# Altium footprint library USB Connectors.PcbLib: 41 footprints (part 2 of 3)
Each footprint in its own frame and in the unit in brackets; x right, y up, seen from the top. Pads: shape width x height; smd on the part's side, far side on the other; paste and mask are expansions set on the pad; w line width, h text height; cw(c..) or ccw(c..) is an arc to the next point about the centre after c.
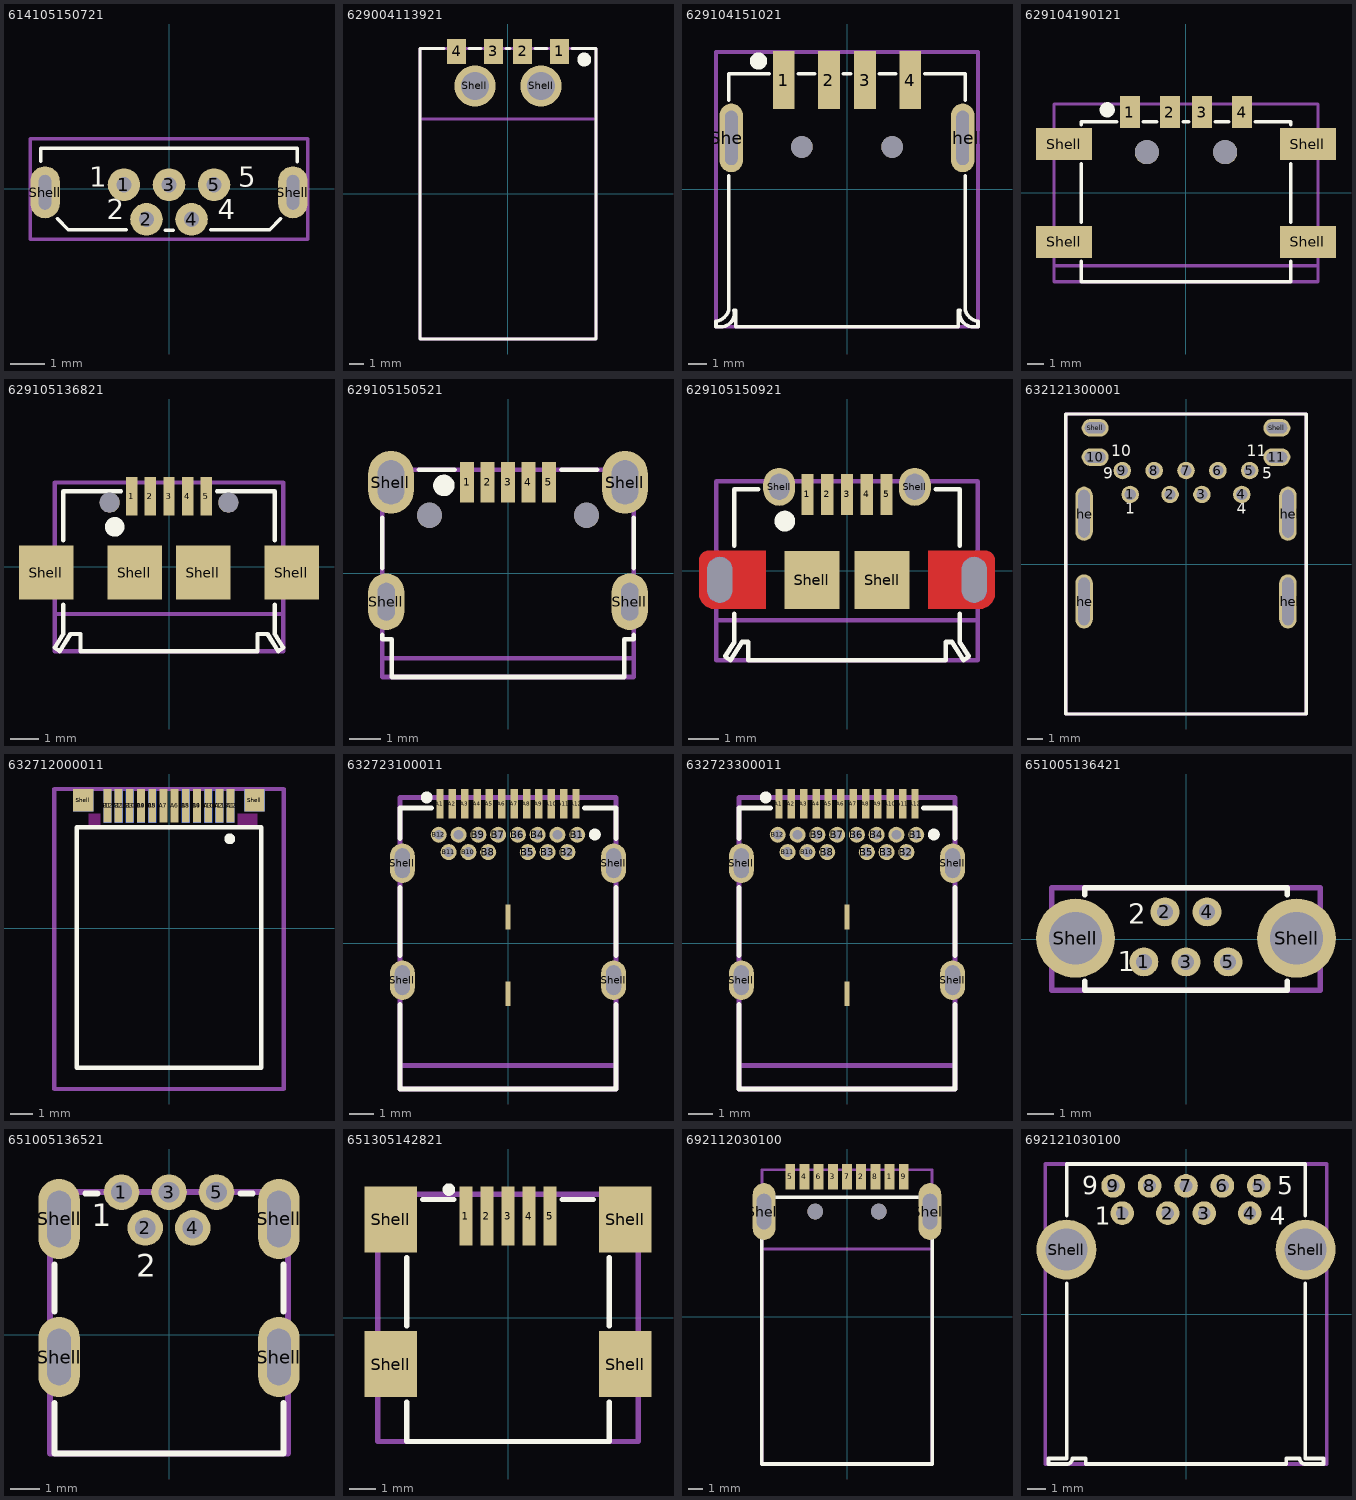
[diagram p1: the footprints below, top view; thin cyan lines are the x and y axes]

## 614105150721 [mm] "Micro USB 2.0 Type B Vertical 5 Contacts"
height 5.61
pads (7):
  round 0.94 hole 0.44: 1(-1.3,0.125) 2(-0.65,-0.875) 3(0,0.125) 4(0.65,-0.875) 5(1.3,0.125)
  oval 0.85x1.5 hole 0.35 slot 1 at 90 deg: Shell(-3.575,-0.095) Shell(3.575,-0.095)
Top Overlay:
  lines w0.1: -3.7,0.795 -3.7,1.175 3.7,1.175 3.7,0.785 ; -3.225,-0.85 -2.9,-1.175 -1.23,-1.175 ; -0.11,-1.185 0.12,-1.185 ; 1.21,-1.175 2.9,-1.175 3.225,-0.85
  text "4" at 1.4,-1.075 h1
  text "5" at 2,-0.14 h1
  text "2" at -1.8,-1.075 h1
  text "1" at -2.3,-0.14 h1
Mechanical 13:
  lines w0.1: -4,-1.45 -4,1.45 4,1.45 4,-1.45 -4,-1.45
3D body "614105150721.stp": height 5.61, standoff -1.84, extent -4,-1.45 4,1.45

## 629004113921 [mm] "USB 2.0 Plug Type A SMT with Clip"
height 19.8
pads (6):
  rect 1.3x1.7 smd: 1(3.5,9.7) 2(1,9.7) 3(-1,9.7) 4(-3.5,9.7)
  round 2.8 hole 1.9: Shell(-2.25,7.35) Shell(2.25,7.35)
Top Overlay:
  circle w0.5: c5.2,9.15 r0.224
  lines w0.2: -4.35,9.9 -6,9.9 -6,-9.9 6,-9.9 6,9.9 4.35,9.9 ; -2.65,9.9 -1.85,9.9 ; -0.15,9.9 0.15,9.9 ; 1.85,9.9 2.65,9.9
Mechanical 13:
  lines w0.2: -6,-9.9 -6,9.9 6,9.9 6,-9.9 -6,-9.9
Mechanical 15:
  lines w0.2: -6,5.1 6,5.1
  text "PCB Edge" at -2,4.05 h1
3D body "629004113921.stp": height 2.25, standoff -2.25, extent -6,-9.9 6,9.9

## 629104151021 [mm] "USB 2.0 Type A Horizontal SMT with pegs"
height 7
pads (8):
  rect 1.2x3.2 smd: 1(-3.5,6.05) 2(-1,6.05) 3(1,6.05) 4(3.5,6.05)
  oval 1.3x3.8 hole 0.7 slot 3 at 90 deg: Shell(-6.4,2.85) Shell(6.4,2.85)
  round 1.2 hole 1.2 unplated: ""(-2.5,2.35) ""(2.5,2.35)
Top Overlay:
  circle w0.5: c-4.9,7.1 r0.224
  lines w0.2: -7.25,-7.308 -7.25,-7.6 -6.87,-7.599 ccw(c-6.983,-6.857) -6.25,-6.7 -6.15,-6.7 -6.15,-7.6 6.15,-7.6 6.15,-6.7 6.25,-6.7 ccw(c6.983,-6.857) 6.87,-7.599 7.25,-7.6 7.25,-7.308 ; -7.249,-7.308 ccw(c-7.39,-6.44) -6.55,-6.7 -6.55,0.76 ; -6.55,4.94 -6.55,6.4 -4.3,6.4 ; -2.7,6.4 -1.8,6.4 ; -0.2,6.4 0.2,6.4 ; 1.8,6.4 2.7,6.4 ; 4.3,6.4 6.55,6.4 6.55,4.94 ; 6.55,0.76 6.55,-6.7 ccw(c7.39,-6.44) 7.249,-7.308
Mechanical 13:
  lines w0.2: -7.25,-7.6 7.25,-7.6 7.25,7.6 -7.25,7.6 -7.25,-7.6
3D body "629104151021.stp": height 7.4, standoff -2.1, extent -7.25,-7.6 7.25,7.6

## 629104190121 [mm] "USB 2.0 Type A Horizontal SMT Short Type"
height 6.3
pads (10):
  rect 1.25x2 smd: 1(-3.5,5.045) 2(-1,5.045) 3(1,5.045) 4(3.5,5.045)
  rect 3.5x2 smd: Shell(-7.625,-3.055) Shell(-7.625,3.045) Shell(7.625,-3.055) Shell(7.625,3.045)
  round 1.5 hole 1.5 unplated: ""(-2.45,2.545) ""(2.45,2.545)
Top Overlay:
  circle w0.5: c-4.924,5.195 r0.224
  lines w0.2: -6.55,-4.255 -6.55,-5.555 6.55,-5.555 6.55,-4.255 ; -6.55,-1.855 -6.55,1.845 ; -6.55,4.245 -6.55,4.445 -4.32,4.445 ; -2.68,4.445 -1.82,4.445 ; -0.18,4.445 0.18,4.445 ; 1.82,4.445 2.68,4.445 ; 4.32,4.445 6.55,4.445 6.55,4.245 ; 6.55,-1.855 6.55,1.845
Mechanical 13:
  lines w0.2: -8.25,-5.555 8.25,-5.555 8.25,5.555 -8.25,5.555 -8.25,-5.555
Mechanical 15:
  lines w0.2: -8.25,-4.555 8.25,-4.555
  text "PCB Edge" at -2,-4.155 h1
3D body "STEP-629104190121-rev1.stp": height 6.37, standoff -0.1, extent -8.25,-5.555 8.25,5.554

## 629105136821 [mm] "Micro USB 2.0 SMT Type B Horizontal 5 Contacts"
height 3
pads (11):
  rect 0.4x1.35 smd: 1(-1.3,2.475) 2(-0.65,2.475) 3(0,2.475) 4(0.65,2.475) 5(1.3,2.475)
  rect 1.9x1.9 smd: Shell(-4.3,-0.2) Shell(-1.2,-0.2) Shell(1.2,-0.2) Shell(4.3,-0.2)
  round 0.7 hole 0.7 unplated: ""(-2.075,2.25) ""(2.075,2.25)
Top Overlay:
  circle w0.4: c-1.9,1.4 r0.141
  lines w0.15: -3.7,-1.33 -3.7,-2.35 -4,-2.825 -3.825,-2.95 -3.45,-2.35 -3.1,-2.35 -3.1,-2.95 3.1,-2.95 3.1,-2.35 3.45,-2.35 3.825,-2.95 4,-2.825 3.7,-2.35 3.7,-1.33 ; -3.7,0.93 -3.7,2.65 -1.68,2.65 ; 1.68,2.65 3.7,2.65 3.7,0.93
Mechanical 13:
  lines w0.15: -4,-2.95 4,-2.95 4,2.95 -4,2.95 -4,-2.95
Mechanical 15:
  lines w0.15: -4,-1.65 4,-1.65
  text "PCB Edge" at -1.8,-2.45 h1
3D body "629105136821.stp": height 2.75, standoff -0.61, extent -4,-2.95 4,2.973

## 629105150521 [mm] "Micro USB 2.0 SMT Type B Horizontal 5 Contacts High Current"
height 2.66
pads (11):
  rect 0.45x1.3 smd: 1(-1.3,2.9) 2(-0.65,2.9) 3(0,2.9) 4(0.65,2.9) 5(1.3,2.9)
  oval 1.15x1.8 hole 0.55 slot 1.2 at 90 deg: Shell(-3.875,-0.9) Shell(3.875,-0.9)
  oval 1.45x2 hole 0.85 slot 1.4 at 90 deg: Shell(-3.725,2.9) Shell(3.725,2.9)
  round 0.8 hole 0.8 unplated: ""(-2.5,1.85) ""(2.5,1.85)
Top Overlay:
  circle w0.4: c-2.041,2.8 r0.141
  lines w0.15: -4,-1.96 -4,-2.1 -3.7,-2.1 -3.7,-3.3 3.7,-3.3 3.7,-2.1 4,-2.1 4,-1.96 ; -4,0.17 -4,1.77 ; -2.83,3.3 -1.7,3.3 ; 1.7,3.3 2.83,3.3 ; 4,0.17 4,1.77
Mechanical 13:
  lines w0.15: -4,-3.3 4,-3.3 4,3.3 -4,3.3 -4,-3.3
Mechanical 15:
  lines w0.15: -4,-2.7 4,-2.7
  text "PCB Edge" at -1.9,-2.4 h1
3D body "Download_STP_629105150521.stp": height 2.71, standoff -0.85, extent -4,-3.3 4,3.303

## 629105150921 [mm] "Micro USB 2.0 Type AB Horizontal"
height 3
pads (11):
  rect 0.4x1.35 smd: 1(-1.3,2.51) 2(-0.65,2.51) 3(0,2.51) 4(0.65,2.51) 5(1.3,2.51)
  round 0 / inner round 0 / far side oval 1.4x2.1 hole 0.825 slot 1.5 at 90 deg: Shell(-4.175,-0.295) Shell(4.175,-0.295)
  oval 1.05x1.25 hole 0.65 slot 0.85 at 90 deg: Shell(-2.225,2.76) Shell(2.225,2.76)
  rect 1.8x1.9 smd: Shell(-1.15,-0.295) Shell(1.15,-0.295)
Top Layer:
  region: 4.353,-1.245 4.452,-1.245 4.636,-1.169 4.776,-1.028 4.852,-0.844 4.852,-0.745 4.852,0.355 4.852,0.415 4.807,0.525 4.722,0.609 4.612,0.655 4.553,0.655 2.668,0.655 2.668,-1.245
  region: -4.353,-1.245 -4.452,-1.245 -4.636,-1.169 -4.776,-1.028 -4.852,-0.844 -4.852,-0.745 -4.852,0.355 -4.852,0.415 -4.807,0.525 -4.722,0.609 -4.612,0.655 -4.553,0.655 -2.668,0.655 -2.668,-1.245
Top Overlay:
  circle w0.4: c-2.041,1.632 r0.141
  lines w0.15: -3.7,-1.415 -3.7,-2.335 -4,-2.81 -3.825,-2.935 -3.45,-2.335 -3.24,-2.335 -3.24,-2.935 3.24,-2.935 3.24,-2.335 3.45,-2.335 3.825,-2.935 4,-2.81 3.7,-2.335 3.7,-1.415 ; -3.7,0.825 -3.7,2.675 -2.92,2.675 ; 2.92,2.675 3.7,2.675 3.7,0.825
Mechanical 13:
  lines w0.15: -4.3,-2.935 4.3,-2.935 4.3,2.935 -4.3,2.935 -4.3,-2.935
Mechanical 15:
  lines w0.15: -4.3,-1.625 4.3,-1.625
  text "PCB Edge" at -1.9,-2.5 h1
3D body "629105150921.stp": height 2.78, standoff -0.5, extent -4.3,-2.935 4.3,2.935

## 632121300001 [mm] "USB 3.1 Type A Receptacle Horizontal THT Power Delivery"
height 8.01
pads (17):
  round 1.1 hole 0.7: 1(-3.5,4.365) 2(-1,4.365) 3(1,4.365) 4(3.5,4.365) 5(4,5.865) 6(2,5.865) 7(0,5.865) 8(-2,5.865) 9(-4,5.865)
  oval 1.7x1.1 hole 0.7 slot 1.3 at 0 deg: 10(-5.7,6.705) 11(5.7,6.705) Shell(-5.7,8.545) Shell(5.7,8.545)
  oval 1.1x3.4 hole 0.7 slot 3 at 90 deg: Shell(-6.4,-2.345) Shell(-6.4,3.155) Shell(6.4,-2.345) Shell(6.4,3.155)
Top Overlay:
  lines w0.2: -7.55,-9.415 7.55,-9.415 7.55,9.415 -7.55,9.415 -7.55,-9.415
  text "1" at -3.8,2.9 h1.2
  text "4" at 3.2,2.903 h1.2
  text "5" at 4.8,5.113 h1.2
  text "9" at -5.2,5.1 h1.2
  text "10" at -4.7,6.513 h1.2
  text "11" at 3.8,6.5 h1.2
Mechanical 13:
  lines w0.2: -7.55,-9.415 -7.55,9.415 7.55,9.415 7.55,-9.415 -7.55,-9.415
3D body "632121300001.stp": height 8.01, standoff -1.81, extent -7.55,-9.415 7.55,9.415

## 632712000011 [mm] "USB 3.1 Type C Plug Horizontal SMT"
height 2.4
pads (26):
  rect 0.35x1.5 smd: A1(2.75,5.475) A2(2.25,5.475) A3(1.75,5.475) A4(1.25,5.475) A5(0.75,5.475) A6(0.25,5.475) A7(-0.25,5.475) A8(-0.75,5.475) A9(-1.25,5.475) A10(-1.75,5.475) A11(-2.25,5.475) A12(-2.75,5.475)
  rect 0.35x1.5 smd far side: B1(-2.75,5.475) B2(-2.25,5.475) B3(-1.75,5.475) B4(-1.25,5.475) B5(-0.75,5.475) B8(0.75,5.475) B9(1.25,5.475) B10(1.75,5.475) B11(2.25,5.475) B12(2.75,5.475)
  rect 0.9x1 smd: Shell(-3.83,5.725) Shell(3.82,5.725)
  rect 0.9x1 smd far side: Shell(-3.83,5.725) Shell(3.82,5.725)
Top Overlay:
  circle w0.25: c2.712,4 r0.114
  lines w0.2: -4.125,-6.225 -4.125,4.525 4.125,4.525 4.125,-6.225 -4.125,-6.225
Bottom Overlay:
  circle w0.25: c-2.712,4 r0.114
  lines w0.2: -4.125,-6.225 4.125,-6.225 4.125,4.525 -4.125,4.525 -4.125,-6.225
Keep-Out Layer:
  board cut-out: -3.58,4.525 -3.58,5.125 -3.08,5.125 -3.08,4.525
  board cut-out: 3.075,4.525 3.075,5.125 3.945,5.125 3.945,4.525
Mechanical 13:
  lines w0.2: -5.125,-7.175 5.125,-7.175 5.125,6.225 -5.125,6.225 -5.125,-7.175
3D body "632712000011.stp": height 1.9, standoff -2.3, extent -5.125,-7.175 5.125,6.225

## 632723100011 [mm] "USB 3.1 Type C Receptacle Horizontal THR"
height 2.96
pads (32):
  rect 0.3x1.2 smd: A1(-2.75,5.635) A2(-2.25,5.635) A3(-1.75,5.635) A4(-1.25,5.635) A5(-0.75,5.635) A6(-0.25,5.635) A7(0.25,5.635) A8(0.75,5.635) A9(1.25,5.635) A10(1.75,5.635) A11(2.25,5.635) A12(2.75,5.635)
  round 0.65 hole 0.4: B1(2.8,4.385) B2(2.4,3.685) B3(1.6,3.685) B4(1.2,4.385) B5(0.8,3.685) B6(0.4,4.385) B7(-0.4,4.385) B8(-0.8,3.685) B9(-1.2,4.385) B10(-1.6,3.685) B11(-2.4,3.685) B12(-2.8,4.385) Shell(-2,4.385) Shell(2,4.385)
  oval 1x1.6 hole 0.6 slot 1.2 at 90 deg: Shell(-4.27,-1.495) Shell(-4.27,3.235) Shell(4.27,-1.495) Shell(4.27,3.235)
  rect 0.2x1 smd: ""(0,-2.045) ""(0,1.055)
Top Overlay:
  circle w0.25: c-3.288,5.895 r0.114
  circle w0.25: c3.512,4.395 r0.114
  lines w0.2: -4.37,-2.485 -4.37,-5.895 4.37,-5.895 4.37,-2.485 ; -4.37,-0.495 -4.37,2.245 ; -4.37,4.225 -4.37,5.465 -3.1,5.465 ; 3.1,5.465 4.37,5.465 4.37,4.225 ; 4.37,-0.495 4.37,2.245
Mechanical 13:
  lines w0.2: -4.37,-5.895 4.37,-5.895 4.37,5.895 -4.37,5.895 -4.37,-5.895
Mechanical 15:
  lines w0.2: -4.37,-4.945 4.37,-4.945
3D body "632723100011.stp": height 3.05, standoff -1.41, extent -4.37,-5.895 4.37,5.899

## 632723300011 [mm] "USB 3.1 Type C Receptacle Horizontal THR"
height 2.96
pads (32):
  rect 0.3x1.2 smd: A1(-2.75,5.635) A2(-2.25,5.635) A3(-1.75,5.635) A4(-1.25,5.635) A5(-0.75,5.635) A6(-0.25,5.635) A7(0.25,5.635) A8(0.75,5.635) A9(1.25,5.635) A10(1.75,5.635) A11(2.25,5.635) A12(2.75,5.635)
  round 0.65 hole 0.4: B1(2.8,4.385) B2(2.4,3.685) B3(1.6,3.685) B4(1.2,4.385) B5(0.8,3.685) B6(0.4,4.385) B7(-0.4,4.385) B8(-0.8,3.685) B9(-1.2,4.385) B10(-1.6,3.685) B11(-2.4,3.685) B12(-2.8,4.385) Shell(-2,4.385) Shell(2,4.385)
  oval 1x1.6 hole 0.6 slot 1.2 at 90 deg: Shell(-4.27,-1.495) Shell(-4.27,3.235) Shell(4.27,-1.495) Shell(4.27,3.235)
  rect 0.2x1 smd: ""(0,-2.045) ""(0,1.055)
Top Overlay:
  circle w0.25: c3.512,4.395 r0.114
  circle w0.25: c-3.288,5.895 r0.114
  lines w0.2: -4.37,-2.485 -4.37,-5.895 4.37,-5.895 4.37,-2.485 ; -4.37,-0.495 -4.37,2.245 ; -4.37,4.225 -4.37,5.465 -3.1,5.465 ; 3.1,5.465 4.37,5.465 4.37,4.225 ; 4.37,-0.495 4.37,2.245
Mechanical 13:
  lines w0.2: -4.37,-5.895 -4.37,5.895 4.37,5.895 4.37,-5.895 -4.37,-5.895
Mechanical 15:
  lines w0.2: -4.37,-4.945 4.37,-4.945
3D body "632723300011.stp": height 3.05, standoff -1.81, extent -4.37,-5.895 4.37,5.899

## 651005136421 [mm] "Mini USB 2.0 Type B Vertical 5 Contacts"
height 9.2
pads (7):
  round 1.1 hole 0.6: 1(-1.6,-0.87) 2(-0.8,1.03) 3(0,-0.87) 4(0.8,1.03) 5(1.6,-0.87)
  round 3 hole 2: Shell(-4.2,0.03) Shell(4.2,0.03)
Top Overlay:
  lines w0.2: -3.85,-1.6 -3.85,-1.95 3.85,-1.95 3.85,-1.6 ; -3.85,1.67 -3.85,1.95 3.85,1.95 3.85,1.67
  text "1" at -2.6,-1.22 h0.76
  text "2" at -2.2,0.58 h0.76
Mechanical 13:
  lines w0.2: -5.1,-1.95 5.1,-1.95 5.1,1.95 -5.1,1.95 -5.1,-1.95
3D body "651005136421.stp": height 9.45, standoff -2.75, extent -5.102,-1.92 5.102,1.98

## 651005136521 [mm] "Mini USB 2.0 Type B Horizontal 5 Contacts"
height 3.9
pads (9):
  round 1.2 hole 0.7: 1(-1.6,4.8) 2(-0.8,3.6) 3(0,4.8) 4(0.8,3.6) 5(1.6,4.8)
  oval 1.4x2.7 hole 0.8 slot 1.9 at 90 deg: Shell(-3.7,-0.75) Shell(-3.7,3.9) Shell(3.7,-0.75) Shell(3.7,3.9)
Top Overlay:
  lines w0.2: -3.85,-2.29 -3.85,-4 3.85,-4 3.85,-2.29 ; -3.85,0.78 -3.85,2.36 ; -2.82,4.75 -2.4,4.75 ; 2.4,4.75 2.82,4.75 ; 3.85,0.78 3.85,2.36
  text "1" at -2.6,3.65 h0.76
  text "2" at -1.1,1.95 h0.76
Mechanical 13:
  lines w0.2: -4,-4 4,-4 4,4.8 -4,4.8 -4,-4
3D body "651005136521-rev1.stp": height 3.95, standoff -2.55, extent -4.075,-4 4.075,4.825

## 651305142821 [mm] "Mini USB 2.0 Type AB SMT Horizontal 5 Contacts"
height 4
pads (9):
  rect 0.5x2.25 smd: 1(-1.6,3.865) 2(-0.8,3.865) 3(0,3.865) 4(0.8,3.865) 5(1.6,3.865)
  rect 2x2.5 smd: Shell(-4.45,-1.76) Shell(-4.45,3.74) Shell(4.45,-1.76) Shell(4.45,3.74)
Top Overlay:
  circle w0.25: c-2.248,4.872 r0.114
  lines w0.2: -3.85,-3.21 -3.85,-4.7 3.85,-4.7 3.85,-3.21 ; -3.85,-0.31 -3.85,2.29 ; -3.25,4.5 -2.05,4.5 ; 2.05,4.5 3.25,4.5 ; 3.85,-0.31 3.85,2.29
Mechanical 13:
  lines w0.2: -4.95,-4.7 -4.95,4.7 4.95,4.7 4.95,-4.7 -4.95,-4.7
3D body "651305142821.stp": height 4.1, standoff 0, extent -4.95,-4.7 4.95,4.7

## 692112030100 [mm] "USB 3.0 Type A SMT Plug with Clip"
height 4.5
pads (13):
  rect 0.7x1.8 smd: 1(3,9.875) 2(1,9.875) 3(-1,9.875) 4(-3,9.875) 5(-4,9.875) 6(-2,9.875) 7(0,9.875) 8(2,9.875) 9(4,9.875)
  oval 1.6x4 hole 1 slot 2.5 at 90 deg: Shell(-5.85,7.425) Shell(5.85,7.425)
  round 1.1 hole 1.1 unplated: ""(-2.25,7.425) ""(2.25,7.425)
Top Overlay:
  lines w0.254: -6,-10.375 6,-10.375 6,8.425 -6,8.425 -6,-10.375
Mechanical 13:
  lines w0.2: -6,-10.375 6,-10.375 6,10.375 -6,10.375 -6,-10.375
Mechanical 15:
  lines w0.2: -6,4.775 6,4.775
  text "PCB Edge" at -2,3.725 h1
3D body "692112030100.stp": height 1.85, standoff -2.65, extent -6,-10.375 6,10.375

## 692121030100 [mm] "USB 3.0 Type A Horizontal"
height 6.99
pads (11):
  round 1.3 hole 0.7: 1(-3.5,5.54) 2(-1,5.54) 3(1,5.54) 4(3.5,5.54) 5(4,7.04) 6(2,7.04) 7(0,7.04) 8(-2,7.04) 9(-4,7.04)
  round 3.3 hole 2.3: Shell(-6.57,3.54) Shell(6.57,3.54)
Top Overlay:
  lines w0.2: -6.55,1.69 -6.55,-7.94 -7.55,-7.94 -7.55,-8.24 -6.56,-8.24 ccw(c-6.55,-7.94) -6.25,-7.94 -5.5,-7.94 -5.5,-8.24 5.5,-8.24 5.5,-7.94 6.25,-7.94 ccw(c6.55,-7.94) 6.56,-8.24 7.55,-8.24 7.55,-7.94 6.55,-7.94 6.55,1.69 ; -6.55,5.39 -6.55,8.24 6.55,8.24 6.55,5.39
  text "5" at 5,6.59 h1
  text "4" at 4.6,4.89 h1
  text "9" at -5.7,6.59 h1
  text "1" at -5,4.89 h1
Mechanical 13:
  lines w0.2: -7.74,-8.24 -7.74,8.24 7.74,8.24 7.74,-8.24 -7.74,-8.24
3D body "692121030100.stp": height 8.02, standoff -3.2, extent -7.74,-8.24 7.74,8.31